# Altium footprint library ESKDPcbLib.PcbLib: 608 footprints (part 27 of 38)
Each footprint in its own frame and in the unit in brackets; x right, y up, seen from the top. Pads: shape width x height; smd on the part's side, far side on the other; paste and mask are expansions set on the pad; w line width, h text height; cw(c..) or ccw(c..) is an arc to the next point about the centre after c.
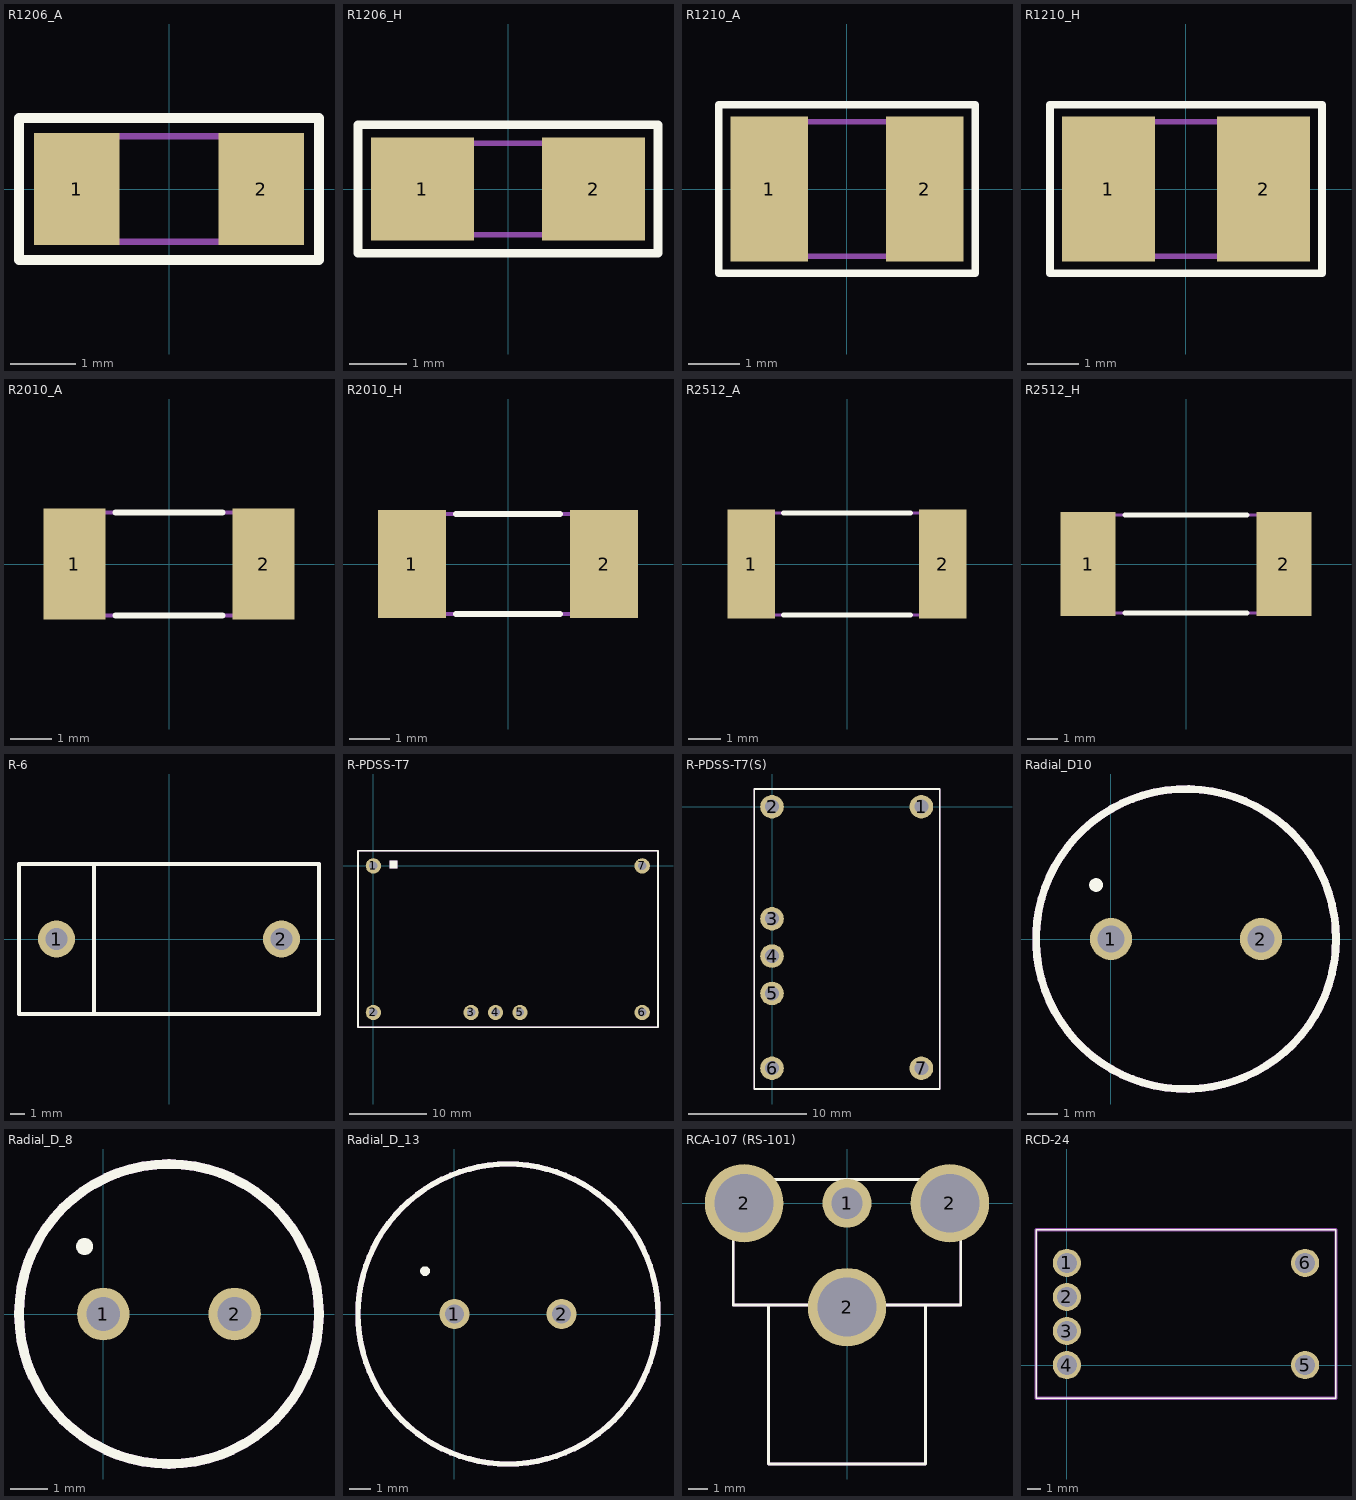
[diagram p26: the footprints below, top view; thin cyan lines are the x and y axes]

## R1206_A [mm]
height 0.55
pads (2):
  rect 1.3x1.7 smd: 1(-1.4,0) 2(1.4,0)
Top Overlay:
  lines w0.15: -2.28,-1.08 -2.28,1.08 2.28,1.08 2.28,-1.08 -2.28,-1.08
Mechanical 7:
  lines w0.1: -1.55,-0.8 1.55,-0.8 1.55,0.8 -1.55,0.8 -1.55,-0.8
Mechanical 10:
  text ".Designator" at -0.55,1.31 h0.8
  text ".Comment" at -0.58,-1.69 h0.6
3D body "RES1206.step": height 0.6, standoff 0, extent -1.6,-0.8 1.6,0.8

## R1206_H [mm]
height 0.55
pads (2):
  rect 1.8x1.8 smd: 1(-1.5,0) 2(1.5,0)
Top Overlay:
  lines w0.15: -2.63,-1.13 2.63,-1.13 2.63,1.13 -2.63,1.13 -2.63,-1.13
Mechanical 7:
  lines w0.1: -1.55,-0.8 1.55,-0.8 1.55,0.8 -1.55,0.8 -1.55,-0.8
Mechanical 10:
  text ".Comment" at -0.58,-1.75 h0.6
  text ".Designator" at -0.55,1.31 h0.8
3D body: height 0.55, standoff 0, extent -1.55,-0.8 1.55,0.8

## R1210_A [mm]
height 0.55
pads (2):
  rect 1.5x2.8 smd: 1(-1.5,0) 2(1.5,0)
Top Overlay:
  lines w0.15: -2.48,-1.63 2.48,-1.63 2.48,1.63 -2.48,1.63 -2.48,-1.63
Mechanical 7:
  lines w0.1: -1.55,-1.3 -1.55,1.3 1.55,1.3 1.55,-1.3 -1.55,-1.3
Mechanical 10:
  text ".Designator" at -0.71,1.89 h0.8
  text ".Comment" at -0.76,-2.28 h0.6
3D body "RES1210.STEP": height 0.63, standoff 0, extent -2.163,-1.353 2.037,1.347

## R1210_H [mm]
height 0.55
pads (2):
  rect 1.8x2.8 smd: 1(-1.5,0) 2(1.5,0)
Top Overlay:
  lines w0.15: -2.63,-1.63 2.63,-1.63 2.63,1.63 -2.63,1.63 -2.63,-1.63
Mechanical 7:
  lines w0.1: -1.55,-1.3 1.55,-1.3 1.55,1.3 -1.55,1.3 -1.55,-1.3
Mechanical 10:
  text ".Designator" at -0.71,1.89 h0.8
  text ".Comment" at -0.81,-2.25 h0.6
3D body: height 0.55, standoff 0, extent -1.55,-1.3 1.55,1.3

## R2010_A [mm]
height 0.55
pads (2):
  rect 1.5x2.7 smd: 1(-2.3,0) 2(2.3,0)
Top Overlay:
  lines w0.15: -1.3,-1.25 1.3,-1.25 ; -1.3,1.25 1.3,1.25
Mechanical 7:
  lines w0.1: -2.5,-1.25 -2.5,1.25 2.5,1.25 2.5,-1.25 -2.5,-1.25
Mechanical 10:
  text ".Designator" at -0.5,1.85 h0.8
  text ".Comment" at -0.46,-2 h0.6
3D body "RES2010.step": height 0.6, standoff 0, extent -2.5,-1.25 2.5,1.25

## R2010_H [mm]
height 0.55
pads (2):
  rect 1.7x2.7 smd: 1(-2.4,0) 2(2.4,0)
Top Overlay:
  lines w0.15: -1.3,-1.25 1.3,-1.25 ; -1.3,1.25 1.3,1.25
Mechanical 7:
  lines w0.1: -2.5,-1.25 2.5,-1.25 2.5,1.25 -2.5,1.25 -2.5,-1.25
Mechanical 10:
  text ".Designator" at -0.5,1.85 h0.8
  text ".Comment" at -0.48,-2.04 h0.6
3D body: height 0.55, standoff 0, extent -2.5,-1.25 2.5,1.25

## R2512_A [mm]
height 0.55
pads (2):
  rect 1.5x3.4 smd: 1(-3,0) 2(3,0)
Top Overlay:
  lines w0.15: -2,-1.6 2,-1.6 ; -2,1.6 2,1.6
Mechanical 7:
  lines w0.1: -3.175,-1.6 -3.175,1.6 3.175,1.6 3.175,-1.6 -3.175,-1.6
Mechanical 10:
  text ".Designator" at -0.51,1.96 h0.8
  text ".Comment" at -0.5,-2.32 h0.6
3D body "RES2512.step": height 0.62, standoff 0, extent -3.159,-1.6 3.16,1.6

## R2512_H [mm]
height 0.55
pads (2):
  rect 1.8x3.4 smd: 1(-3.2,0) 2(3.2,0)
Top Overlay:
  lines w0.15: -2,-1.6 2,-1.6 ; -2,1.6 2,1.6
Mechanical 7:
  lines w0.1: -3.175,-1.6 3.175,-1.6 3.175,1.6 -3.175,1.6 -3.175,-1.6
Mechanical 10:
  text ".Comment" at -0.57,-2.39 h0.6
  text ".Designator" at -0.51,1.96 h0.8
3D body: height 0.55, standoff 0, extent -3.175,-1.6 3.175,1.6

## R-6 [mm]
height 2.67
pads (2):
  round 2.5 hole 1.5 unplated: 1(-7.62,0) 2(7.62,0)
Top Overlay:
  lines w0.254: -5.08,-5.08 -5.08,5.08 ; -10.16,-5.08 -10.16,5.08 10.16,5.08 10.16,-5.08 -10.16,-5.08
Mechanical 7:
  lines w0.254: -5.08,-5.08 -5.08,5.08 ; -10.16,-5.08 -10.16,2.54 -10.16,5.08 10.16,5.08 10.16,-5.08 -10.16,-5.08
Mechanical 10:
  text ".Comment" at -7.874,7.112 h0.8
  text ".Designator" at -7.874,7.874 h0.8
3D body "Diode R-6 diameter 9_1 pitch 600mils.STEP": height 9.56, standoff -5.15, extent -8.27,-4.56 8.27,4.56

## R-PDSS-T7 [mm]
pads (7):
  round 2 hole 1.1: 1(0,0) 2(0,-19.05) 3(12.7,-19.05) 4(15.88,-19.05) 5(19.06,-19.05) 6(34.94,-19.05) 7(34.94,0)
Top Overlay:
  rectangle: 2.125,-0.325 3.125,0.675
  lines w0.2: -2,-21 -2,2 37,2 37,-21 -2,-21
Mechanical 7:
  rectangle: 2.125,-0.325 3.125,0.675
  lines w0.2: -2,-21 37,-21 37,2 -2,2 -2,-21
Mechanical 10:
  text ".Comment" at 32.5,-22.4 h0.6
  text ".Designator" at 33.23,3.24 h0.8
3D body: height 9, standoff 0, extent -2,-21 37,2

## R-PDSS-T7(S) [mm]
height 9
pads (7):
  round 2 hole 1.2: 1(12.7,0) 2(0,0) 3(0,-9.52) 4(0,-12.7) 5(0,-15.88) 6(0,-22.23) 7(12.7,-22.23)
Top Overlay:
  lines w0.15: -1.5,-24 14.25,-24 14.25,1.5 -1.5,1.5 -1.5,-24
Mechanical 7:
  lines w0.15: -1.5,-24 -1.5,1.5 14.25,1.5 14.25,-24 -1.5,-24
Mechanical 10:
  text ".Comment" at 11,2 h0.6
  text ".Designator" at 11.25,2.75 h0.8
3D body: height 9, standoff 0, extent -1.5,-24 14.25,1.5

## Radial_D10 [mm]
pads (2):
  round 1.4 hole 0.9: 1(0,0) 2(5,0)
Top Overlay:
  circle w0.254: c-0.5,1.8 r0.1
  circle w0.254: c2.5,0 r5
Mechanical 1:
  circle w0.254: c2.5,0 r5
3D body: height 12, standoff -2.5, extent -2.5,-4.9 7.5,5.1

## Radial_D_8 [mm]
pads (2):
  round 1.4 hole 0.9: 1(0,0) 2(3.5,0)
Top Overlay:
  circle w0.254: c1.75,0 r4
  circle w0.254: c-0.5,1.8 r0.1
Mechanical 1:
  circle w0.254: c1.75,0 r4
3D body: height 12, standoff -2.5, extent -2.3,-3.9 5.7,4.1

## Radial_D_13 [mm]
pads (2):
  round 1.4 hole 0.9: 1(0,0) 2(5,0)
Top Overlay:
  circle w0.254: c2.5,0 r7
  circle w0.254: c-1.37,2 r0.1
Mechanical 1:
  circle w0.254: c2.5,0 r7
3D body: height 22, standoff 0, extent -4.445,-6.986 9.5,6.986

## RCA-107 (RS-101) [mm]
pads (4):
  round 2.5 hole 1.6: 1(0,0)
  round 4 hole 3: 2(-5.25,0) 2(0,-5.3) 2(5.25,0)
Top Overlay:
  lines w0.15: -4,-5.2 -4,-13.3 4,-13.3 4,-5.2 ; -5.8,-5.2 -5.8,1.2 5.8,1.2 5.8,-5.2 -5.8,-5.2
Mechanical 7:
  lines w0.15: -4,-5.2 -4,-13.3 4,-13.3 4,-5.2 ; -5.8,-5.2 5.8,-5.2 5.8,1.2 -5.8,1.2 -5.8,-5.2
Mechanical 10:
  text ".Designator" at -6.3,6.5 h1.52
  text ".Comment" at -6.1,3.2 h1.52
3D body: height 11.9, standoff -4.3, extent -5.8,-13.3 5.8,1.2

## RCD-24 [mm]
pads (6):
  round 2.1 hole 1.5: 1(0,7.62) 2(0,5.08) 3(0,2.54) 4(0,0) 5(17.78,0) 6(17.78,7.62)
Top Overlay:
  lines w0.1: -2.3,-2.46 -2.3,10.08 20.08,10.08 20.08,-2.46 -2.3,-2.46
Mechanical 1:
  lines w0.254: -2.3,-2.46 20.08,-2.46 20.08,10.08 -2.3,10.08 -2.3,-2.46
Mechanical 7:
  lines w0.254: -2.3,-2.46 -2.3,10.08 20.08,10.08 20.08,-2.46 -2.3,-2.46
3D body: height 8, standoff 0, extent -2.3,-2.46 20.08,10.08